# Altium footprint library Connector.PcbLib: 148 footprints (part 1 of 10)
Each footprint in its own frame and in the unit in brackets; x right, y up, seen from the top. Pads: shape width x height; smd on the part's side, far side on the other; paste and mask are expansions set on the pad; w line width, h text height; cw(c..) or ccw(c..) is an arc to the next point about the centre after c.
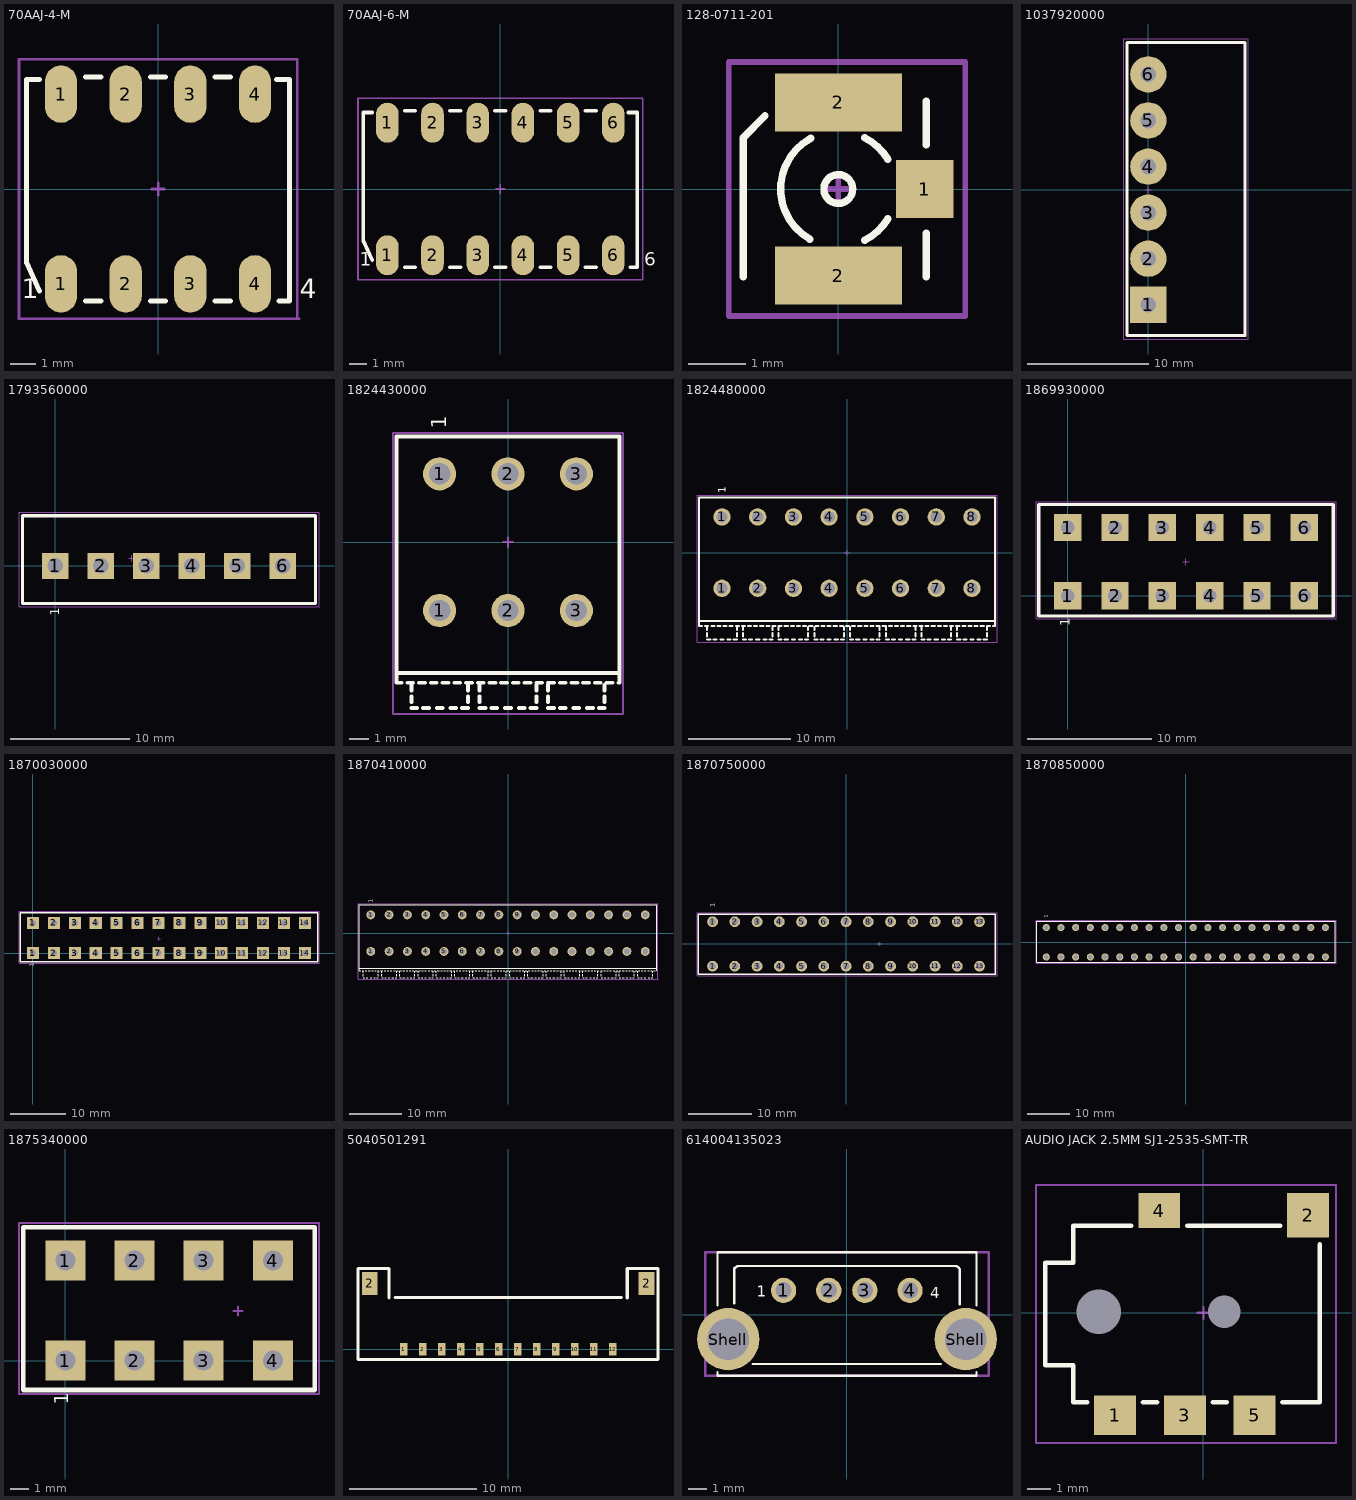
[diagram p0: the footprints below, top view; thin cyan lines are the x and y axes]

## 70AAJ-4-M [mm]
height 3.81
pads (8):
  oval 1.27x2.25 smd: 1(-3.81,-3.725) 1(-3.81,3.725) 2(-1.27,-3.725) 2(-1.27,3.725) 3(1.27,-3.725) 3(1.27,3.725) 4(3.81,-3.725) 4(3.81,3.725)
Top Overlay:
  lines w0.2: -4.66,-4 -5.16,-2.9 -5.16,4.3 -4.66,4.3 ; -2.84,-4.4 -2.24,-4.4 ; -2.84,4.4 -2.24,4.4 ; -0.3,-4.4 0.3,-4.4 ; -0.3,4.4 0.3,4.4 ; 2.24,-4.4 2.84,-4.4 ; 2.24,4.4 2.84,4.4 ; 4.66,4.3 5.16,4.3 5.16,-4.4 4.76,-4.4
  text "4" at 5.56,-4.3 h0.76
  text "1" at -5.36,-4.3 h0.76
Mechanical 15:
  lines w0.1: -0.25,0 0.25,0 ; 0,-0.25 0,0.25 ; 5.46,-5.1 5.46,5.1 -5.46,5.1 -5.46,-5.1 5.54,-5.1
3D body "70aaj004m0.STEP": height 4.05, standoff 0.05, extent -5.042,-4.25 5.042,4.234

## 70AAJ-6-M [mm]
height 3.81
pads (12):
  oval 1.27x2.25 smd: 1(-6.35,-3.725) 1(-6.35,3.725) 2(-3.81,-3.725) 2(-3.81,3.725) 3(-1.27,-3.725) 3(-1.27,3.725) 4(1.27,-3.725) 4(1.27,3.725) 5(3.81,-3.725) 5(3.81,3.725) 6(6.35,-3.725) 6(6.35,3.725)
Top Overlay:
  lines w0.2: -7.2,-4 -7.7,-2.9 -7.7,4.3 -7.2,4.3 ; -5.38,-4.4 -4.78,-4.4 ; -5.38,4.4 -4.78,4.4 ; -2.84,-4.4 -2.24,-4.4 ; -2.84,4.4 -2.24,4.4 ; -0.3,-4.4 0.3,-4.4 ; -0.3,4.4 0.3,4.4 ; 2.24,-4.4 2.84,-4.4 ; 2.24,4.4 2.84,4.4 ; 4.78,-4.4 5.38,-4.4 ; 4.78,4.4 5.38,4.4 ; 7.2,4.3 7.7,4.3 7.7,-4.4 7.3,-4.4
  text "6" at 8.1,-4.3 h0.76
  text "1" at -7.9,-4.3 h0.76
Mechanical 15:
  lines w0.1: -0.25,0 0.25,0 ; 0,-0.25 0,0.25 ; -8,-5.1 8,-5.1 8,5.1 -8,5.1 -8,-5.1
3D body "70aaj006m0.STEP": height 4.05, standoff 0.05, extent -7.582,-4.259 7.582,4.225

## 128-0711-201 [mm]
pads (3):
  rect 1x1 smd mask+0.064: 1(1.5,0)
  rect 2.2x1 smd mask+0.064: 2(0,-1.5) 2(0,1.5)
Top Overlay:
  circle w0.127: c0,0 r0.25
  lines w0.127: -1.651,-1.524 -1.651,0.889 -1.27,1.27 ; -0.496,-0.868 cw(c0,0) -0.477,0.879 ; 0.457,-0.889 ccw(c0,0) 0.857,-0.514 ; 0.457,0.889 cw(c0,0) 0.857,0.514 ; 1.524,-1.524 1.524,-0.762 ; 1.524,0.762 1.524,1.524
Mechanical 15:
  lines w0.1: -0.25,0 0.25,0 ; 0,-0.25 0,0.25 ; -1.9,-2.2 2.2,-2.2 2.2,2.2 -1.9,2.2 -1.9,-2.2
3D body "User Library-20279-001.step": height 1.25, standoff -0.01, extent -1.55,-1.5 1.55,1.5

## 1037920000 [mm] "TERM BLOCK HDR 6POS 90DEG 3.81MM"
height 7.1
pads (6):
  rect 3x3 hole 1.3: 1(0,-9.525)
  round 3 hole 1.3: 2(0,-5.715) 3(0,-1.905) 4(0,1.905) 5(0,5.715) 6(0,9.525)
Top Overlay:
  lines w0.2: 8.032,-2.952 8.032,5.748
  lines w0.254: -1.743,-12.075 -1.743,12.175 -1.168,12.175 8.007,12.175 8.007,-12.05 7.983,-12.075 -1.743,-12.075
Mechanical 15:
  lines w0.1: -0.25,0 0.25,0 ; 0,-0.25 0,0.25 ; -2.018,-12.35 8.257,-12.35 8.257,12.45 -2.018,12.45 -2.018,-12.35
3D body "SC 3.81_06_270G 3.2 SN SW 1037920000.STEP": height 7.09, standoff -3.21, extent -1.171,-12.065 8.029,12.185

## 1793560000 [mm] "PCB plug-in connector, male header, closed side, THT solder connection, 3.81 mm, No. of poles: 6, 180°, Solder pin length (l): 3.2 mm, tinned, Black, Box"
height 9.2
pads (6):
  rect 2.2x2.2 hole 1.3: 1(0,0) 2(3.81,0) 3(7.62,0) 4(11.43,0) 5(15.24,0) 6(19.05,0)
Top Overlay:
  lines w0.254: -2.75,-3.15 21.8,-3.15 21.8,4.2 -2.75,4.2 -2.75,-3.15
  text "1" at 0.35,-4.15 h0.76
Mechanical 15:
  lines w0.1: 6.17,0.625 6.67,0.625 ; 6.42,0.375 6.42,0.875 ; -3.025,-3.425 -3.025,4.475 22.075,4.475 22.075,-3.425 -3.025,-3.425
3D body "SC 3.81_6_180G3.2SN SW 1793560000.STEP": height 9.2, standoff -3.2, extent -2.605,-3 21.645,4.05

## 1824430000 [mm] "CONN TERM BLK 3POS 3.5MM R/A PCB"
height 8.5
pads (6):
  round 1.7 hole 1.1: 1(-3.5,-3.5) 1(-3.5,3.5) 2(0,-3.5) 2(0,3.5) 3(3.5,-3.5) 3(3.5,3.5)
Top Overlay:
  lines w0.2: -5.45,-7.2 -5.7,-7.2 -5.7,-6.7 ; -5.15,-7.2 -4.85,-7.2 ; -4.95,-8.5 -4.65,-8.5 ; -4.95,-8.2 -4.95,-7.9 ; -4.95,-7.6 -4.95,-7.3 ; -4.55,-7.2 -4.25,-7.2 ; -4.35,-8.5 -4.05,-8.5 ; -3.95,-7.2 -3.65,-7.2 ; -3.65,-8.5 -3.35,-8.5 ; -3.35,-7.2 -3.05,-7.2 ; -2.95,-8.5 -2.65,-8.5 ; -2.75,-7.2 -2.45,-7.2 ; -2.35,-8.5 -2.05,-8.5 ; -2.15,-7.2 -1.85,-7.2 ; -2.05,-8.2 -2.05,-7.9 ; -2.05,-7.6 -2.05,-7.3 ; -1.55,-7.2 -1.25,-7.2 ; -1.45,-8.5 -1.15,-8.5 ; -1.45,-8.2 -1.45,-7.9 ; -1.45,-7.6 -1.45,-7.3 ; -0.95,-7.2 -0.65,-7.2 ; -0.85,-8.5 -0.55,-8.5 ; -0.35,-7.2 -0.05,-7.2 ; -0.15,-8.5 0.15,-8.5 ; 0.25,-7.2 0.55,-7.2 ; 0.55,-8.5 0.85,-8.5 ; 0.85,-7.2 1.15,-7.2 ; 1.15,-8.5 1.45,-8.5 ; 1.45,-8.2 1.45,-7.9 ; 1.45,-7.6 1.45,-7.3 ; 1.45,-7.2 1.75,-7.2 ; 2.05,-8.5 2.35,-8.5 ; 2.05,-8.2 2.05,-7.9 ; 2.05,-7.6 2.05,-7.3 ; 2.05,-7.2 2.35,-7.2 ; 2.65,-8.5 2.95,-8.5 ; 2.65,-7.2 2.95,-7.2 ; 3.25,-7.2 3.55,-7.2 ; 3.35,-8.5 3.65,-8.5 ; 3.85,-7.2 4.15,-7.2 ; 4.05,-8.5 4.35,-8.5 ; 4.45,-7.2 4.75,-7.2 ; 4.65,-8.5 4.95,-8.5 ; 4.95,-8.2 4.95,-7.9 ; 4.95,-7.6 4.95,-7.3 ; 5.05,-7.2 5.35,-7.2 ; 5.65,-7.2 5.7,-7.2 5.7,-6.7 ; -5.7,-6.7 5.7,-6.7 ; -5.7,-6.7 -5.7,5.4 5.7,5.4 5.7,-6.7
  text "1" at -3.15,5.8 h0.76
Mechanical 15:
  lines w0.1: -0.25,0 0.25,0 ; 0,-0.25 0,0.25 ; -5.9,-8.8 -5.9,5.6 5.9,5.6 5.9,-8.8 -5.9,-8.8
3D body "LSF-SMT 3.5_3_90 3.5 SW 1824430000.STEP": height 8.6, standoff -3.4, extent -5.6,-8.4 5.6,5.2

## 1824480000 [mm] "CONN TERM BLK 8POS 3.5MM R/A PCB"
height 8.5
pads (16):
  round 1.7 hole 1.1: 1(-12.25,-3.5) 1(-12.25,3.5) 2(-8.75,-3.5) 2(-8.75,3.5) 3(-5.25,-3.5) 3(-5.25,3.5) 4(-1.75,-3.5) 4(-1.75,3.5) 5(1.75,-3.5) 5(1.75,3.5) 6(5.25,-3.5) 6(5.25,3.5) 7(8.75,-3.5) 7(8.75,3.5) 8(12.25,-3.5) 8(12.25,3.5)
Top Overlay:
  lines w0.2: -14.2,-7.2 -14.5,-7.2 -14.5,-6.7 ; -13.9,-7.2 -13.6,-7.2 ; -13.7,-8.5 -13.4,-8.5 ; -13.7,-8.2 -13.7,-7.9 ; -13.7,-7.6 -13.7,-7.3 ; -13.3,-7.2 -13,-7.2 ; -13.1,-8.5 -12.8,-8.5 ; -12.7,-7.2 -12.4,-7.2 ; -12.4,-8.5 -12.1,-8.5 ; -12.1,-7.2 -11.8,-7.2 ; -11.7,-8.5 -11.4,-8.5 ; -11.5,-7.2 -11.2,-7.2 ; -11.1,-8.5 -10.8,-8.5 ; -10.9,-7.2 -10.6,-7.2 ; -10.8,-8.2 -10.8,-7.9 ; -10.8,-7.6 -10.8,-7.3 ; -10.3,-7.2 -10,-7.2 ; -10.2,-8.5 -9.9,-8.5 ; -10.2,-8.2 -10.2,-7.9 ; -10.2,-7.6 -10.2,-7.3 ; -9.7,-7.2 -9.4,-7.2 ; -9.6,-8.5 -9.3,-8.5 ; -9.1,-7.2 -8.8,-7.2 ; -8.9,-8.5 -8.6,-8.5 ; -8.5,-7.2 -8.2,-7.2 ; -8.2,-8.5 -7.9,-8.5 ; -7.9,-7.2 -7.6,-7.2 ; -7.6,-8.5 -7.3,-8.5 ; -7.3,-8.2 -7.3,-7.9 ; -7.3,-7.6 -7.3,-7.3 ; -7.3,-7.2 -7,-7.2 ; -6.7,-8.5 -6.4,-8.5 ; -6.7,-8.2 -6.7,-7.9 ; -6.7,-7.6 -6.7,-7.3 ; -6.7,-7.2 -6.4,-7.2 ; -6.1,-8.5 -5.8,-8.5 ; -6.1,-7.2 -5.8,-7.2 ; -5.5,-7.2 -5.2,-7.2 ; -5.4,-8.5 -5.1,-8.5 ; -4.9,-7.2 -4.6,-7.2 ; -4.7,-8.5 -4.4,-8.5 ; -4.3,-7.2 -4,-7.2 ; -4.1,-8.5 -3.8,-8.5 ; -3.8,-8.2 -3.8,-7.9 ; -3.8,-7.6 -3.8,-7.3 ; -3.7,-7.2 -3.4,-7.2 ; -3.2,-8.5 -2.9,-8.5 ; -3.2,-8.2 -3.2,-7.9 ; -3.2,-7.6 -3.2,-7.3 ; -3.1,-7.2 -2.8,-7.2 ; -2.6,-8.5 -2.3,-8.5 ; -2.5,-7.2 -2.2,-7.2 ; -1.9,-8.5 -1.6,-8.5 ; -1.9,-7.2 -1.6,-7.2 ; -1.3,-7.2 -1,-7.2 ; -1.2,-8.5 -0.9,-8.5 ; -0.7,-7.2 -0.4,-7.2 ; -0.6,-8.5 -0.3,-8.5 ; -0.3,-8.2 -0.3,-7.9 ; -0.3,-7.6 -0.3,-7.3 ; -0.1,-7.2 0.2,-7.2 ; 0.3,-8.5 0.6,-8.5 ; 0.3,-8.2 0.3,-7.9 ; 0.3,-7.6 0.3,-7.3 ; 0.5,-7.2 0.8,-7.2 ; 0.9,-8.5 1.2,-8.5 ; 1.1,-7.2 1.4,-7.2 ; 1.6,-8.5 1.9,-8.5 ; 1.7,-7.2 2,-7.2 ; 2.3,-8.5 2.6,-8.5 ; 2.3,-7.2 2.6,-7.2 ; 2.9,-8.5 3.2,-8.5 ; 2.9,-7.2 3.2,-7.2 ; 3.2,-8.2 3.2,-7.9 ; 3.2,-7.6 3.2,-7.3 ; 3.5,-7.2 3.8,-7.2 ; 3.8,-8.5 4.1,-8.5 ; 3.8,-8.2 3.8,-7.9 ; 3.8,-7.6 3.8,-7.3 ; 4.1,-7.2 4.4,-7.2 ; 4.4,-8.5 4.7,-8.5 ; 4.7,-7.2 5,-7.2 ; 5.1,-8.5 5.4,-8.5 ; 5.3,-7.2 5.6,-7.2 ; 5.8,-8.5 6.1,-8.5 ; 5.9,-7.2 6.2,-7.2 ; 6.4,-8.5 6.7,-8.5 ; 6.5,-7.2 6.8,-7.2 ; 6.7,-8.2 6.7,-7.9 ; 6.7,-7.6 6.7,-7.3 ; 7.1,-7.2 7.4,-7.2 ; 7.3,-8.5 7.6,-8.5 ; 7.3,-8.2 7.3,-7.9 ; 7.3,-7.6 7.3,-7.3 ; 7.7,-7.2 8,-7.2 ; 7.9,-8.5 8.2,-8.5 ; 8.3,-7.2 8.6,-7.2 ; 8.6,-8.5 8.9,-8.5 ; 8.9,-7.2 9.2,-7.2 ; 9.3,-8.5 9.6,-8.5 ; 9.5,-7.2 9.8,-7.2 ; 9.9,-8.5 10.2,-8.5 ; 10.1,-7.2 10.4,-7.2 ; 10.2,-8.2 10.2,-7.9 ; 10.2,-7.6 10.2,-7.3 ; 10.7,-7.2 11,-7.2 ; 10.8,-8.5 11.1,-8.5 ; 10.8,-8.2 10.8,-7.9 ; 10.8,-7.6 10.8,-7.3 ; 11.3,-7.2 11.6,-7.2 ; 11.4,-8.5 11.7,-8.5 ; 11.9,-7.2 12.2,-7.2 ; 12.1,-8.5 12.4,-8.5 ; 12.5,-7.2 12.8,-7.2 ; 12.8,-8.5 13.1,-8.5 ; 13.1,-7.2 13.4,-7.2 ; 13.4,-8.5 13.7,-8.5 ; 13.7,-8.2 13.7,-7.9 ; 13.7,-7.6 13.7,-7.3 ; 13.7,-7.2 14,-7.2 ; 14.3,-7.2 14.5,-7.2 14.5,-6.7 ; -14.5,-6.7 -14.5,5.4 14.5,5.4 14.5,-6.7 ; -14.5,-6.7 14.5,-6.7
  text "1" at -11.9,5.8 h0.76
Mechanical 15:
  lines w0.1: -0.25,0 0.25,0 ; 0,-0.25 0,0.25 ; -14.7,-8.8 14.7,-8.8 14.7,5.6 -14.7,5.6 -14.7,-8.8
3D body "LSF-SMT 3.5_8_90 3.5 SW 1824480000(1).STEP": height 8.6, standoff -3.4, extent -14.35,-8.4 14.35,5.2

## 1869930000 [mm] "PCB terminal, 3.81 mm, No. of poles: 6, 180°, Solder pin length (l): 1.5 mm, Black, PUSH IN, Clamping range, rated connection, max.: 1.5 mm², Tube; Rs = 109 - 1012 ?"
height 14
pads (12):
  rect 2.2x2.2 hole 1.1: 1(0,0) 1(0,5.5) 2(3.81,0) 2(3.81,5.5) 3(7.62,0) 3(7.62,5.5) 4(11.43,0) 4(11.43,5.5) 5(15.24,0) 5(15.24,5.5) 6(19.05,0) 6(19.05,5.5)
Top Overlay:
  lines w0.254: -2.325,-1.625 -2.325,7.35 21.375,7.35 21.375,-1.625 -2.325,-1.625
  text "1" at 0.15,-2.45 h0.76
Mechanical 15:
  lines w0.1: 9.27,2.725 9.77,2.725 ; 9.52,2.475 9.52,2.975 ; -2.55,-1.85 21.6,-1.85 21.6,7.575 -2.55,7.575 -2.55,-1.85
3D body "LSF-SMT3.81_6_180 1.5 SW 1869930000.STEP": height 13.6, standoff -1.5, extent -2.1,-1.375 21.15,7.125

## 1870030000 [mm] "PCB terminal, 3.81 mm, No. of poles: 14, 180°, Solder pin length (l): 1.5 mm, Black, PUSH IN, Clamping range, rated connection, max.: 1.5 mm², Tube; Rs = 109 - 1012 ?"
height 14
pads (28):
  rect 2.2x2.2 hole 1.1: 1(0,0) 1(0,5.5) 2(3.81,0) 2(3.81,5.5) 3(7.62,0) 3(7.62,5.5) 4(11.43,0) 4(11.43,5.5) 5(15.24,0) 5(15.24,5.5) 6(19.05,0) 6(19.05,5.5) 7(22.86,0) 7(22.86,5.5) 8(26.67,0) 8(26.67,5.5) 9(30.48,0) 9(30.48,5.5) 10(34.29,0) 10(34.29,5.5) 11(38.1,0) 11(38.1,5.5) 12(41.91,0) 12(41.91,5.5) 13(45.72,0) 13(45.72,5.5) 14(49.53,0) 14(49.53,5.5)
Top Overlay:
  lines w0.254: -2.325,-1.625 51.875,-1.625 51.875,7.35 -2.325,7.35 -2.325,-1.625
  text "1" at 0.15,-2.45 h0.76
Mechanical 15:
  lines w0.1: 22.695,2.6 23.195,2.6 ; 22.945,2.35 22.945,2.85 ; -2.55,-1.85 -2.55,7.575 52.1,7.575 52.1,-1.85 -2.55,-1.85
3D body "88888888888888888888888888888.STEP": height 13.6, standoff -1.5, extent -2.1,-1.375 51.63,7.125

## 1870410000 [mm] "CONN TERM BLK 16POS 3.5MM R/A PCB"
height 8.5
pads (32):
  round 1.7 hole 1.1: 1(-26.25,-3.5) 1(-26.25,3.5) 2(-22.75,-3.5) 2(-22.75,3.5) 3(-19.25,-3.5) 3(-19.25,3.5) 4(-15.75,-3.5) 4(-15.75,3.5) 5(-12.25,-3.5) 5(-12.25,3.5) 6(-8.75,-3.5) 6(-8.75,3.5) 7(-5.25,-3.5) 7(-5.25,3.5) 8(-1.75,-3.5) 8(-1.75,3.5) 9(1.75,-3.5) 9(1.75,3.5) 10(5.25,-3.5) 10(5.25,3.5) 11(8.75,-3.5) 11(8.75,3.5) 12(12.25,-3.5) 12(12.25,3.5) 13(15.75,-3.5) 13(15.75,3.5) 14(19.25,-3.5) 14(19.25,3.5) 15(22.75,-3.5) 15(22.75,3.5) 16(26.25,-3.5) 16(26.25,3.5)
Top Overlay:
  drawing of 245 lines, arcs and shapes, not listed
  text "1" at -25.9,5.8 h0.76
Mechanical 15:
  lines w0.1: -0.25,0 0.25,0 ; 0,-0.25 0,0.25 ; -28.7,-8.8 28.7,-8.8 28.7,5.6 -28.7,5.6 -28.7,-8.8
3D body "LSF-SMT 3.5_16_90 3.5SW 1870410000.STEP": height 8.6, standoff -3.4, extent -28.35,-8.4 28.35,5.2

## 1870750000 [mm] "CONN TERM BLK 13POS 3.5MM R/A PCB"
height 8.5
pads (26):
  round 1.7 hole 1.1: 1(-21,-3.5) 1(-21,3.5) 2(-17.5,-3.5) 2(-17.5,3.5) 3(-14,-3.5) 3(-14,3.5) 4(-10.5,-3.5) 4(-10.5,3.5) 5(-7,-3.5) 5(-7,3.5) 6(-3.5,-3.5) 6(-3.5,3.5) 7(0,-3.5) 7(0,3.5) 8(3.5,-3.5) 8(3.5,3.5) 9(7,-3.5) 9(7,3.5) 10(10.5,-3.5) 10(10.5,3.5) 11(14,-3.5) 11(14,3.5) 12(17.5,-3.5) 12(17.5,3.5) 13(21,-3.5) 13(21,3.5)
Top Overlay:
  lines w0.2: 23.45,-4.8 23.45,4.7 -23.25,4.7 -23.25,-4.8 23.55,-4.8
  text "1" at -20.65,5.8 h0.76
Mechanical 15:
  lines w0.1: 5,0 5.5,0 ; 5.25,-0.25 5.25,0.25 ; -23.45,-5 -23.45,4.9 23.75,4.9 23.75,-5 -23.45,-5
3D body "LSF-SMT3.5_13_180 1.5 SW 1870750000.stp": height 13.7, standoff -1.4, extent -23.15,-4.3 23.05,4.2

## 1870850000 [mm] "CONN TERM BLK 16POS 3.5MM R/A PCB"
height 8.5
pads (40):
  round 1.7 hole 1.1: 1(-33.25,-3.5) 1(-33.25,3.5) 2(-29.75,-3.5) 2(-29.75,3.5) 3(-26.25,-3.5) 3(-26.25,3.5) 4(-22.75,-3.5) 4(-22.75,3.5) 5(-19.25,-3.5) 5(-19.25,3.5) 6(-15.75,-3.5) 6(-15.75,3.5) 7(-12.25,-3.5) 7(-12.25,3.5) 8(-8.75,-3.5) 8(-8.75,3.5) 9(-5.25,-3.5) 9(-5.25,3.5) 10(-1.75,-3.5) 10(-1.75,3.5) 11(1.75,-3.5) 11(1.75,3.5) 12(5.25,-3.5) 12(5.25,3.5) 13(8.75,-3.5) 13(8.75,3.5) 14(12.25,-3.5) 14(12.25,3.5) 15(15.75,-3.5) 15(15.75,3.5) 16(19.25,-3.5) 16(19.25,3.5) 17(22.75,-3.5) 17(22.75,3.5) 18(26.25,-3.5) 18(26.25,3.5) 19(29.75,-3.5) 19(29.75,3.5) 20(33.25,-3.5) 20(33.25,3.5)
Top Overlay:
  lines w0.2: -35.5,-4.8 -35.5,5 35.55,5 35.55,-4.8 19.6,-4.8 -35.5,-4.8
  text "1" at -32.9,5.8 h0.76
Mechanical 15:
  lines w0.1: -0.25,0 0.25,0 ; 0,-0.25 0,0.25 ; -35.7,-5 35.775,-5 35.775,5.2 -35.7,5.2 -35.7,-5
3D body "LSF-SMT3.5_20_180 1.5 SW 1870850000.stp": height 13.7, standoff -1.4, extent -35.5,-4.25 35.2,4.25

## 1875340000 [mm] "PCB terminal, 3.81 mm, No. of poles: 4, 180°, Solder pin length (l): 1.5 mm, Black, PUSH IN, Clamping range, rated connection, max.: 1.5 mm², Tube; Rs = 109 - 1012 ?"
height 14
pads (8):
  rect 2.2x2.2 hole 1.1: 1(0,0) 1(0,5.5) 2(3.81,0) 2(3.81,5.5) 3(7.62,0) 3(7.62,5.5) 4(11.43,0) 4(11.43,5.5)
Top Overlay:
  lines w0.254: -2.325,-1.625 13.75,-1.625 13.75,7.35 -2.325,7.35 -2.325,-1.625
  text "1" at 0.15,-2.45 h0.76
Mechanical 15:
  lines w0.1: 9.27,2.725 9.77,2.725 ; 9.52,2.475 9.52,2.975 ; -2.55,-1.85 -2.55,7.575 13.975,7.575 13.975,-1.85 -2.55,-1.85
3D body "1875340000.stp": height 13.95, standoff -1.5, extent -2.09,-1.4 13.54,7.1

## 5040501291 [mm]
pads (14):
  rect 0.6x1 smd: 1(-8.25,0) 2(-6.75,0) 3(-5.25,0) 4(-3.75,0) 5(-2.25,0) 6(-0.75,0) 7(0.75,0) 8(2.25,0) 9(3.75,0) 10(5.25,0) 11(6.75,0) 12(8.25,0)
  rect 1.25x1.8 smd: 2(-10.922,5.207) 2(10.922,5.207)
Top Overlay:
  lines w0.254: -9.398,4.064 -9.398,6.382 -11.847,6.382 -11.847,-0.793 11.828,-0.793 11.828,6.382 9.398,6.382 9.398,4.064 ; -8.925,4.1 8.925,4.1
3D body "5040501291.stp": height 1.98, standoff -0.02, extent -11.275,-0.34 11.275,6.1

## 614004135023 [mm] "4 pins"
height 14.9
pads (6):
  round 1.4 hole 0.9: 1(-3.51,1.35) 2(-1.01,1.35) 3(0.99,1.35) 4(3.49,1.35)
  round 3.45 hole 2.3: Shell(-6.58,-1.35) Shell(6.58,-1.35)
Top Overlay:
  lines w0.127: -7.175,-3.175 -7.175,-3.38 7.175,-3.38 7.175,-3.175 ; -7.175,0.525 -7.175,3.46 7.175,3.46 7.175,0.525 ; -6.25,0.627 -6.25,2.572 ; -6.25,2.445 cw(c-6,2.445) -6,2.695 6,2.695 cw(c6,2.445) 6.25,2.445 6.25,0.575 ; -5.225,-2.725 5.2,-2.725
  text "1" at -5,1 h0.6
  text "4" at 4.6,0.9 h0.6
Mechanical 13:
  lines w0.127: -7.85,-3.38 7.85,-3.38 7.85,3.46 -7.85,3.46 -7.85,-3.38
3D body "614004135023.stp": height 3.47, standoff -15.33, extent -7.85,-3.38 7.85,3.46

## AUDIO JACK 2.5MM SJ1-2535-SMT-TR [mm]
pads (7):
  rect 0x0 hole 1.9: 0(-4.5,0.05)
  rect 0x0 hole 1.4: 0(0.9,0.05)
  rect 1.8x1.7 smd: 1(-3.8,-4.4) 3(-0.8,-4.4) 5(2.2,-4.4)
  rect 1.8x1.9 smd: 2(4.5,4.2)
  rect 1.8x1.5 smd: 4(-1.9,4.4)
Top Overlay:
  lines w0.2: -5,-3.85 -5.6,-3.85 -5.6,-2.25 -6.8,-2.25 -6.8,2.15 -5.6,2.15 -5.6,3.75 -3.1,3.75 ; -2.6,-3.85 -2,-3.85 ; -0.7,3.75 3.3,3.75 ; 0.4,-3.85 1,-3.85 ; 3.4,-3.85 5,-3.85 5,2.95
Mechanical 15:
  lines w0.1: -0.25,0 0.25,0 ; 0,-0.25 0,0.25 ; -7.2,-5.6 5.7,-5.6 5.7,5.5 -7.2,5.5 -7.2,-5.6
3D body "SJ1-2535-SMT-TR.STEP": height 3.1, standoff -0.4, extent -6.7,-4.75 4.9,4.65